# Altium footprint library Wurth_Elektronik_Electromechanic_Wire_to_Board_Connectors_rev16a.PCBLIB: 662 footprints (part 4 of 42)
Each footprint in its own frame and in the unit in brackets; x right, y up, seen from the top. Pads: shape width x height; smd on the part's side, far side on the other; paste and mask are expansions set on the pad; w line width, h text height; cw(c..) or ccw(c..) is an arc to the next point about the centre after c.
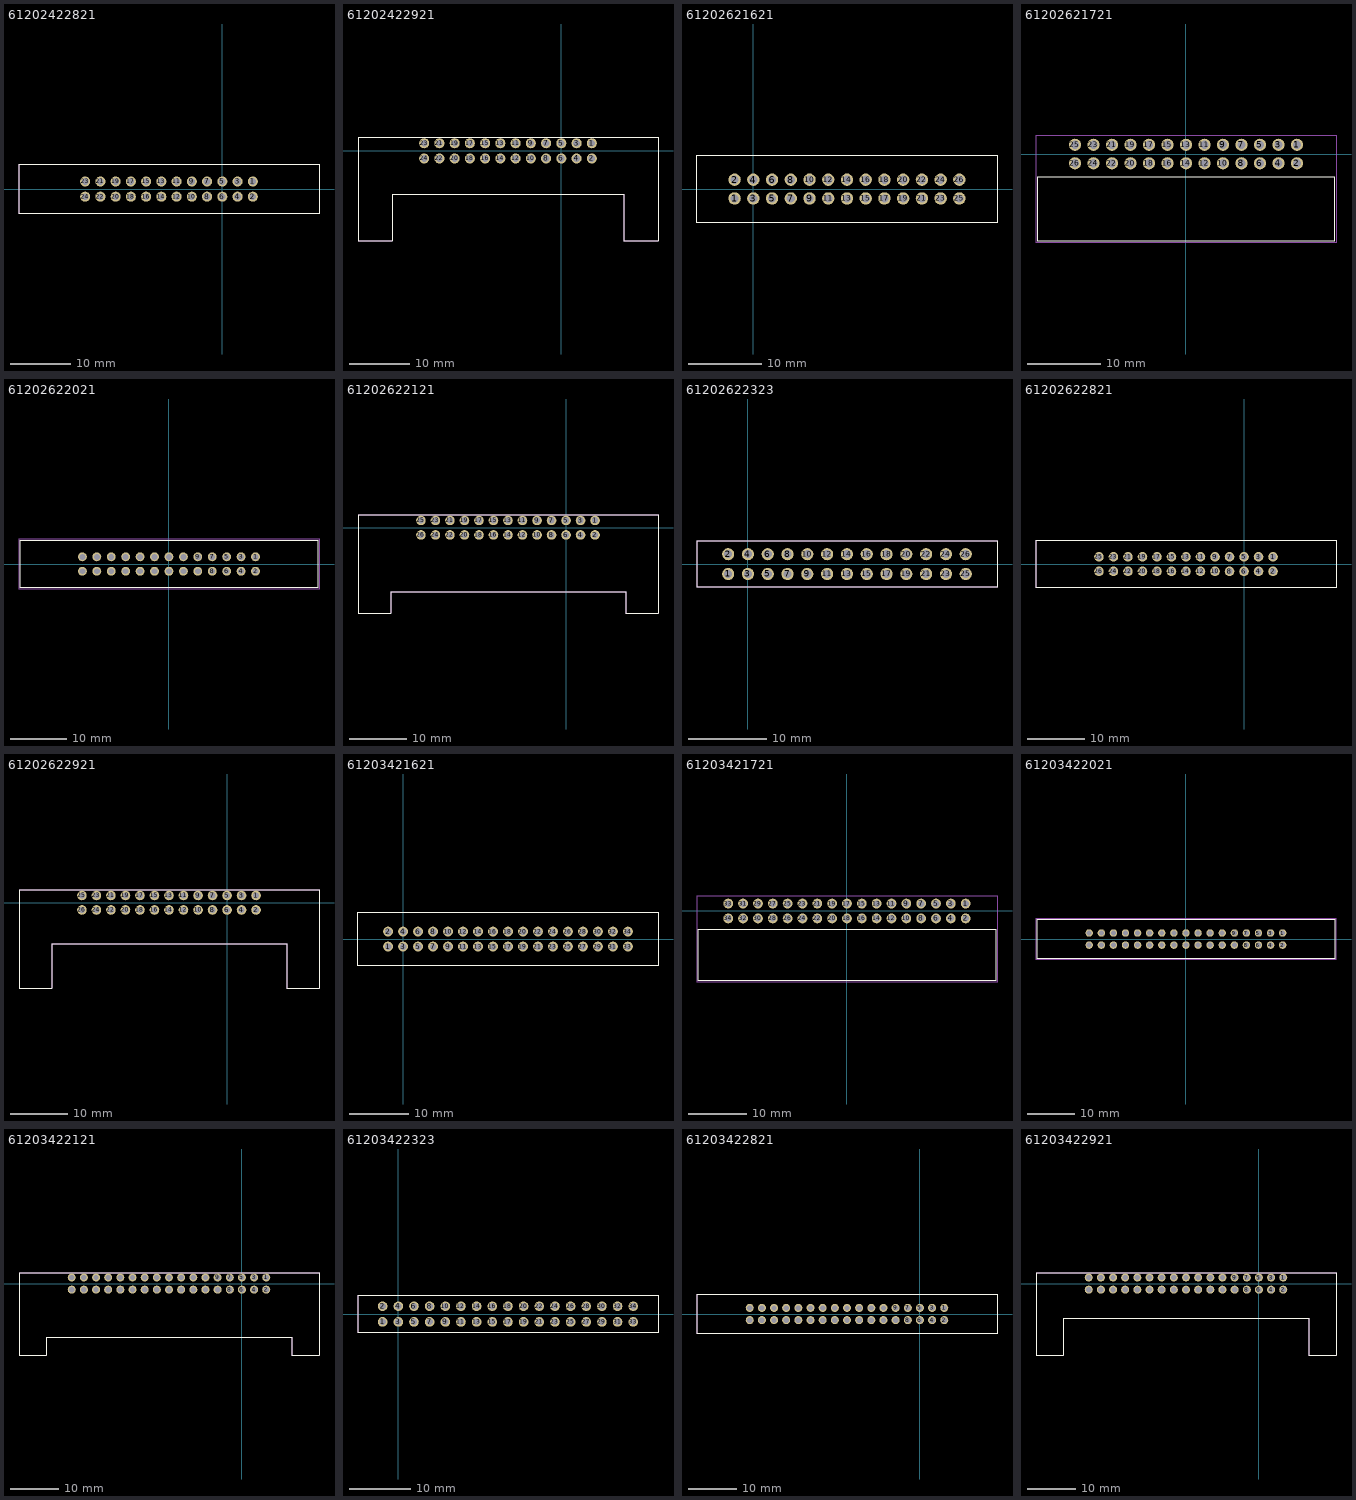
[diagram p3: the footprints below, top view; thin cyan lines are the x and y axes]

## 61202422821 [mil]
pads (24):
  round 66 hole 44: 1(200,50) 2(200,-50) 3(100,50) 4(100,-50) 5(0,50) 6(0,-50) 7(-100,50) 8(-100,-50) 9(-200,50) 10(-200,-50) 11(-300,50) 12(-300,-50) 13(-400,50) 14(-400,-50) 15(-500,50) 16(-500,-50) 17(-600,50) 18(-600,-50) 19(-700,50) 20(-700,-50) 21(-800,50) 22(-800,-50) 23(-900,50) 24(-900,-50)
Top Overlay:
  lines w5: -1333.86,-163.39 634,-163.39 634,164 -1333.86,164 -1333.86,-163.39
Mechanical 2:
  text ">NAME" at -375,200 h77.5
Mechanical 4:
  text ">VALUE" at -400,-250 h77.5
Mechanical 16:
  lines w5: -1333.86,-163.39 634,-163.39 634,164 -1333.86,164 -1333.86,-163.39
  text "1" at 175,25 h77.5
  text "24" at -950,-75 h77.5

## 61202422921 [mil]
pads (24):
  round 66 hole 44: 1(200,50) 2(200,-50) 3(100,50) 4(100,-50) 5(0,50) 6(0,-50) 7(-100,50) 8(-100,-50) 9(-200,50) 10(-200,-50) 11(-300,50) 12(-300,-50) 13(-400,50) 14(-400,-50) 15(-500,50) 16(-500,-50) 17(-600,50) 18(-600,-50) 19(-700,50) 20(-700,-50) 21(-800,50) 22(-800,-50) 23(-900,50) 24(-900,-50)
Top Overlay:
  lines w5: -1333.86,-590.16 -1333.86,90 634,90 634,-590.16 410,-590.16 410,-283.46 -1109.45,-283.46 -1109.45,-590.16 -1333.86,-590.16
Mechanical 2:
  text ">NAME" at -425,125 h77.5
Mechanical 4:
  text ">VALUE" at -461.81,-507.09 h77.5
Mechanical 16:
  lines w5: -1333.86,-590.16 -1109.45,-590.16 -1109.45,-283.46 410,-283.46 410,-590.16 634,-590.16 634,90 -1333.86,90 -1333.86,-590.16
  text "1" at 175,25 h77.5
  text "24" at -925,-75 h77.5

## 61202621621 [mil]
pads (26):
  round 66 hole 44: 1(-100,-50) 2(-100,50) 3(0,-50) 4(0,50) 5(100,-50) 6(100,50) 7(200,-50) 8(200,50) 9(300,-50) 10(300,50) 11(400,-50) 12(400,50) 13(500,-50) 14(500,50) 15(600,-50) 16(600,50) 17(700,-50) 18(700,50) 19(800,-50) 20(800,50) 21(900,-50) 22(900,50) 23(1000,-50) 24(1000,50) 25(1100,-50) 26(1100,50)
Top Overlay:
  lines w5: -300.79,-179.13 1301,-179.13 1301,180 -300.79,180 -300.79,-179.13
Mechanical 2:
  text ">NAME" at 425,200 h77.5
Mechanical 4:
  text ">VALUE" at 400,-250 h77.5
Mechanical 16:
  lines w5: -300.79,-179.13 1301,-179.13 1301,180 -300.79,180 -300.79,-179.13
  text "1" at -125,-75 h77.5
  text "26" at 1057,22 h77.5

## 61202621721 [mil]
pads (26):
  round 66 hole 44: 1(600,50) 2(600,-50) 3(500,50) 4(500,-50) 5(400,50) 6(400,-50) 7(300,50) 8(300,-50) 9(200,50) 10(200,-50) 11(100,50) 12(100,-50) 13(0,50) 14(0,-50) 15(-100,50) 16(-100,-50) 17(-200,50) 18(-200,-50) 19(-300,50) 20(-300,-50) 21(-400,50) 22(-400,-50) 23(-500,50) 24(-500,-50) 25(-600,50) 26(-600,-50)
Top Overlay:
  lines w5: -800.79,-470.87 801,-470.87 801,-122.44 -800.79,-122.44 -800.79,-470.87
Mechanical 2:
  text ">NAME" at 857,-250.7 h77.5
Mechanical 4:
  text ">VALUE" at 857,-348.7 h77.5
Mechanical 16:
  text "1" at 575,25 h77.5
  text "26" at -625,-75 h77.5
  text "2" at 575,-75 h77.5
Mechanical 27:
  lines w5: -810.63,-480.71 811,-480.71 811,103 -810.63,103 -810.63,-480.71

## 61202622021 [mil]
pads (26):
  round 61.5 hole 41: 1(600,50) 2(600,-50) 3(500,50) 4(500,-50) 5(400,50) 6(400,-50) 7(300,50) 8(300,-50) 9(200,50) 10(200,-50) 11(100,50) 12(100,-50) 13(0,50) 14(0,-50) 15(-100,50) 16(-100,-50) 17(-200,50) 18(-200,-50) 19(-300,50) 20(-300,-50) 21(-400,50) 22(-400,-50) 23(-500,50) 24(-500,-50) 25(-600,50) 26(-600,-50)
Top Overlay:
  lines w5: -1029.53,-163.39 1030,-163.39 1030,164 -1029.53,164 -1029.53,-163.39
Mechanical 2:
  text ">NAME" at -125,200 h77.5
Mechanical 4:
  text ">VALUE" at -125,-250 h77.5
Mechanical 16:
  text "1" at 575,25 h77.5
  text "26" at -625,-75 h77.5
Mechanical 27:
  lines w5: -1039.37,-173.23 1040,-173.23 1040,174 -1039.37,174 -1039.37,-173.23

## 61202622121 [mil]
pads (26):
  round 66 hole 44: 1(200,50) 2(200,-50) 3(100,50) 4(100,-50) 5(0,50) 6(0,-50) 7(-100,50) 8(-100,-50) 9(-200,50) 10(-200,-50) 11(-300,50) 12(-300,-50) 13(-400,50) 14(-400,-50) 15(-500,50) 16(-500,-50) 17(-600,50) 18(-600,-50) 19(-700,50) 20(-700,-50) 21(-800,50) 22(-800,-50) 23(-900,50) 24(-900,-50) 25(-1000,50) 26(-1000,-50)
Top Overlay:
  lines w5: -1433.86,-590.55 -1433.86,90 634,90 634,-590.55 410,-590.55 410,-440.94 -1209.45,-440.94 -1209.45,-590.55 -1433.86,-590.55
Mechanical 2:
  text ">NAME" at -425,125 h77.5
Mechanical 4:
  text ">VALUE" at -461.81,-664.57 h77.5
Mechanical 16:
  lines w5: -1433.86,-590.55 -1209.45,-590.55 -1209.45,-440.94 410,-440.94 410,-590.55 634,-590.55 634,90 -1433.86,90 -1433.86,-590.55
  text "1" at 175,25 h77.5
  text "26" at -1025,-75 h77.5

## 61202622323 [mil]
pads (26):
  round 61.5 hole 41: 1(-100,-50) 2(-100,50) 3(0,-50) 4(0,50) 5(100,-50) 6(100,50) 7(200,-50) 8(200,50) 9(300,-50) 10(300,50) 11(400,-50) 12(400,50) 13(500,-50) 14(500,50) 15(600,-50) 16(600,50) 17(700,-50) 18(700,50) 19(800,-50) 20(800,50) 21(900,-50) 22(900,50) 23(1000,-50) 24(1000,50) 25(1100,-50) 26(1100,50)
Top Overlay:
  lines w5: -257.28,-118.11 1258,-118.11 1258,119 -257.28,119 -257.28,-118.11
Mechanical 2:
  text ">NAME" at 400,150 h77.5
Mechanical 4:
  text ">VALUE" at 400,-200 h77.5
Mechanical 16:
  lines w5: -257.28,-118.11 1258,-118.11 1258,119 -257.28,119 -257.28,-118.11
  text "1" at -125,-75 h77.5
  text "26" at 1050,25 h77.5

## 61202622821 [mil]
pads (26):
  round 66 hole 44: 1(200,50) 2(200,-50) 3(100,50) 4(100,-50) 5(0,50) 6(0,-50) 7(-100,50) 8(-100,-50) 9(-200,50) 10(-200,-50) 11(-300,50) 12(-300,-50) 13(-400,50) 14(-400,-50) 15(-500,50) 16(-500,-50) 17(-600,50) 18(-600,-50) 19(-700,50) 20(-700,-50) 21(-800,50) 22(-800,-50) 23(-900,50) 24(-900,-50) 25(-1000,50) 26(-1000,-50)
Top Overlay:
  lines w5: -1433.86,-163.39 634,-163.39 634,164 -1433.86,164 -1433.86,-163.39
Mechanical 2:
  text ">NAME" at -525,200 h77.5
Mechanical 4:
  text ">VALUE" at -525,-250 h77.5
Mechanical 16:
  lines w5: -1433.86,-163.39 634,-163.39 634,164 -1433.86,164 -1433.86,-163.39
  text "1" at 175,25 h77.5
  text "26" at -1025,-75 h77.5

## 61202622921 [mil]
pads (26):
  round 66 hole 44: 1(200,50) 2(200,-50) 3(100,50) 4(100,-50) 5(0,50) 6(0,-50) 7(-100,50) 8(-100,-50) 9(-200,50) 10(-200,-50) 11(-300,50) 12(-300,-50) 13(-400,50) 14(-400,-50) 15(-500,50) 16(-500,-50) 17(-600,50) 18(-600,-50) 19(-700,50) 20(-700,-50) 21(-800,50) 22(-800,-50) 23(-900,50) 24(-900,-50) 25(-1000,50) 26(-1000,-50)
Top Overlay:
  lines w5: -1433.86,-590.16 -1433.86,90 634,90 634,-590.16 410,-590.16 410,-283.46 -1209.45,-283.46 -1209.45,-590.16 -1433.86,-590.16
Mechanical 2:
  text ">NAME" at -425,125 h77.5
Mechanical 4:
  text ">VALUE" at -461.81,-507.09 h77.5
Mechanical 16:
  lines w5: -1433.86,-590.16 -1209.45,-590.16 -1209.45,-283.46 410,-283.46 410,-590.16 634,-590.16 634,90 -1433.86,90 -1433.86,-590.16
  text "1" at 175,25 h77.5
  text "26" at -1025,-75 h77.5

## 61203421621 [mil]
pads (34):
  round 66 hole 44: 1(-100,-50) 2(-100,50) 3(0,-50) 4(0,50) 5(100,-50) 6(100,50) 7(200,-50) 8(200,50) 9(300,-50) 10(300,50) 11(400,-50) 12(400,50) 13(500,-50) 14(500,50) 15(600,-50) 16(600,50) 17(700,-50) 18(700,50) 19(800,-50) 20(800,50) 21(900,-50) 22(900,50) 23(1000,-50) 24(1000,50) 25(1100,-50) 26(1100,50) 27(1200,-50) 28(1200,50) 29(1300,-50) 30(1300,50) 31(1400,-50) 32(1400,50) 33(1500,-50) 34(1500,50)
Top Overlay:
  lines w5: -300.79,-179.13 1701,-179.13 1701,180 -300.79,180 -300.79,-179.13
Mechanical 2:
  text ">NAME" at 625,200 h77.5
Mechanical 4:
  text ">VALUE" at 600,-250 h77.5
Mechanical 16:
  lines w5: -300.79,-179.13 1701,-179.13 1701,180 -300.79,180 -300.79,-179.13
  text "1" at -125,-75 h77.5
  text "34" at 1457,22 h77.5

## 61203421721 [mil]
pads (34):
  round 66 hole 44: 1(800,50) 2(800,-50) 3(700,50) 4(700,-50) 5(600,50) 6(600,-50) 7(500,50) 8(500,-50) 9(400,50) 10(400,-50) 11(300,50) 12(300,-50) 13(200,50) 14(200,-50) 15(100,50) 16(100,-50) 17(0,50) 18(0,-50) 19(-100,50) 20(-100,-50) 21(-200,50) 22(-200,-50) 23(-300,50) 24(-300,-50) 25(-400,50) 26(-400,-50) 27(-500,50) 28(-500,-50) 29(-600,50) 30(-600,-50) 31(-700,50) 32(-700,-50) 33(-800,50) 34(-800,-50)
Top Overlay:
  lines w5: -1000.79,-470.87 1001,-470.87 1001,-122.44 -1000.79,-122.44 -1000.79,-470.87
Mechanical 2:
  text ">NAME" at 1057,-250.7 h77.5
Mechanical 4:
  text ">VALUE" at 1057,-348.7 h77.5
Mechanical 16:
  text "1" at 775,25 h77.5
  text "34" at -850,-75 h77.5
  text "2" at 775,-75 h77.5
Mechanical 27:
  lines w5: -1010.63,-480.71 1011,-480.71 1011,103 -1010.63,103 -1010.63,-480.71

## 61203422021 [mil]
pads (34):
  round 61.5 hole 41: 1(800,50) 2(800,-50) 3(700,50) 4(700,-50) 5(600,50) 6(600,-50) 7(500,50) 8(500,-50) 9(400,50) 10(400,-50) 11(300,50) 12(300,-50) 13(200,50) 14(200,-50) 15(100,50) 16(100,-50) 17(0,50) 18(0,-50) 19(-100,50) 20(-100,-50) 21(-200,50) 22(-200,-50) 23(-300,50) 24(-300,-50) 25(-400,50) 26(-400,-50) 27(-500,50) 28(-500,-50) 29(-600,50) 30(-600,-50) 31(-700,50) 32(-700,-50) 33(-800,50) 34(-800,-50)
Top Overlay:
  lines w5: -1230.32,-163.39 1231,-163.39 1231,164 -1230.32,164 -1230.32,-163.39
Mechanical 2:
  text ">NAME" at -150,200 h77.5
Mechanical 4:
  text ">VALUE" at -150,-250 h77.5
Mechanical 16:
  text "1" at 775,25 h77.5
  text "34" at -825,-75 h77.5
  text "2" at 775,-75 h77.5
Mechanical 27:
  lines w5: -1240.16,-173.23 1241,-173.23 1241,174 -1240.16,174 -1240.16,-173.23

## 61203422121 [mil]
pads (34):
  round 66 hole 44: 1(200,50) 2(200,-50) 3(100,50) 4(100,-50) 5(0,50) 6(0,-50) 7(-100,50) 8(-100,-50) 9(-200,50) 10(-200,-50) 11(-300,50) 12(-300,-50) 13(-400,50) 14(-400,-50) 15(-500,50) 16(-500,-50) 17(-600,50) 18(-600,-50) 19(-700,50) 20(-700,-50) 21(-800,50) 22(-800,-50) 23(-900,50) 24(-900,-50) 25(-1000,50) 26(-1000,-50) 27(-1100,50) 28(-1100,-50) 29(-1200,50) 30(-1200,-50) 31(-1300,50) 32(-1300,-50) 33(-1400,50) 34(-1400,-50)
Top Overlay:
  lines w5: -1833.86,-590.55 -1833.86,90 634,90 634,-590.55 410,-590.55 410,-440.94 -1609.45,-440.94 -1609.45,-590.55 -1833.86,-590.55
Mechanical 2:
  text ">NAME" at -650,125 h77.5
Mechanical 4:
  text ">VALUE" at -611.81,-664.57 h77.5
Mechanical 16:
  lines w5: -1833.86,-590.55 -1609.45,-590.55 -1609.45,-440.94 410,-440.94 410,-590.55 634,-590.55 634,90 -1833.86,90 -1833.86,-590.55
  text "1" at 175,25 h77.5
  text "34" at -1450,-75 h77.5

## 61203422323 [mil]
pads (34):
  round 61.5 hole 41: 1(-100,-50) 2(-100,50) 3(0,-50) 4(0,50) 5(100,-50) 6(100,50) 7(200,-50) 8(200,50) 9(300,-50) 10(300,50) 11(400,-50) 12(400,50) 13(500,-50) 14(500,50) 15(600,-50) 16(600,50) 17(700,-50) 18(700,50) 19(800,-50) 20(800,50) 21(900,-50) 22(900,50) 23(1000,-50) 24(1000,50) 25(1100,-50) 26(1100,50) 27(1200,-50) 28(1200,50) 29(1300,-50) 30(1300,50) 31(1400,-50) 32(1400,50) 33(1500,-50) 34(1500,50)
Top Overlay:
  lines w5: -257.28,-118.11 1658,-118.11 1658,119 -257.28,119 -257.28,-118.11
Mechanical 2:
  text ">NAME" at 600,150 h77.5
Mechanical 4:
  text ">VALUE" at 600,-200 h77.5
Mechanical 16:
  lines w5: -257.28,-118.11 1658,-118.11 1658,119 -257.28,119 -257.28,-118.11
  text "1" at -125,-75 h77.5
  text "34" at 1475,25 h77.5

## 61203422821 [mil]
pads (34):
  round 66 hole 44: 1(200,50) 2(200,-50) 3(100,50) 4(100,-50) 5(0,50) 6(0,-50) 7(-100,50) 8(-100,-50) 9(-200,50) 10(-200,-50) 11(-300,50) 12(-300,-50) 13(-400,50) 14(-400,-50) 15(-500,50) 16(-500,-50) 17(-600,50) 18(-600,-50) 19(-700,50) 20(-700,-50) 21(-800,50) 22(-800,-50) 23(-900,50) 24(-900,-50) 25(-1000,50) 26(-1000,-50) 27(-1100,50) 28(-1100,-50) 29(-1200,50) 30(-1200,-50) 31(-1300,50) 32(-1300,-50) 33(-1400,50) 34(-1400,-50)
Top Overlay:
  lines w5: -1833.86,-163.39 634,-163.39 634,164 -1833.86,164 -1833.86,-163.39
Mechanical 2:
  text ">NAME" at -750,200 h77.5
Mechanical 4:
  text ">VALUE" at -750,-250 h77.5
Mechanical 16:
  lines w5: -1833.86,-163.39 634,-163.39 634,164 -1833.86,164 -1833.86,-163.39
  text "1" at 175,25 h77.5
  text "34" at -1425,-75 h77.5

## 61203422921 [mil]
pads (34):
  round 66 hole 44: 1(200,50) 2(200,-50) 3(100,50) 4(100,-50) 5(0,50) 6(0,-50) 7(-100,50) 8(-100,-50) 9(-200,50) 10(-200,-50) 11(-300,50) 12(-300,-50) 13(-400,50) 14(-400,-50) 15(-500,50) 16(-500,-50) 17(-600,50) 18(-600,-50) 19(-700,50) 20(-700,-50) 21(-800,50) 22(-800,-50) 23(-900,50) 24(-900,-50) 25(-1000,50) 26(-1000,-50) 27(-1100,50) 28(-1100,-50) 29(-1200,50) 30(-1200,-50) 31(-1300,50) 32(-1300,-50) 33(-1400,50) 34(-1400,-50)
Top Overlay:
  lines w5: -1833.86,-590.16 -1833.86,90 634,90 634,-590.16 410,-590.16 410,-283.46 -1609.45,-283.46 -1609.45,-590.16 -1833.86,-590.16
Mechanical 2:
  text ">NAME" at -650,125 h77.5
Mechanical 4:
  text ">VALUE" at -611.81,-507.09 h77.5
Mechanical 16:
  lines w5: -1833.86,-590.16 -1609.45,-590.16 -1609.45,-283.46 410,-283.46 410,-590.16 634,-590.16 634,90 -1833.86,90 -1833.86,-590.16
  text "1" at 175,25 h77.5
  text "34" at -1450,-75 h77.5